# Altium footprint library Footprints_SOC.PcbLib: 182 footprints (part 10 of 12)
Each footprint in its own frame and in the unit in brackets; x right, y up, seen from the top. Pads: shape width x height; smd on the part's side, far side on the other; paste and mask are expansions set on the pad; w line width, h text height; cw(c..) or ccw(c..) is an arc to the next point about the centre after c.
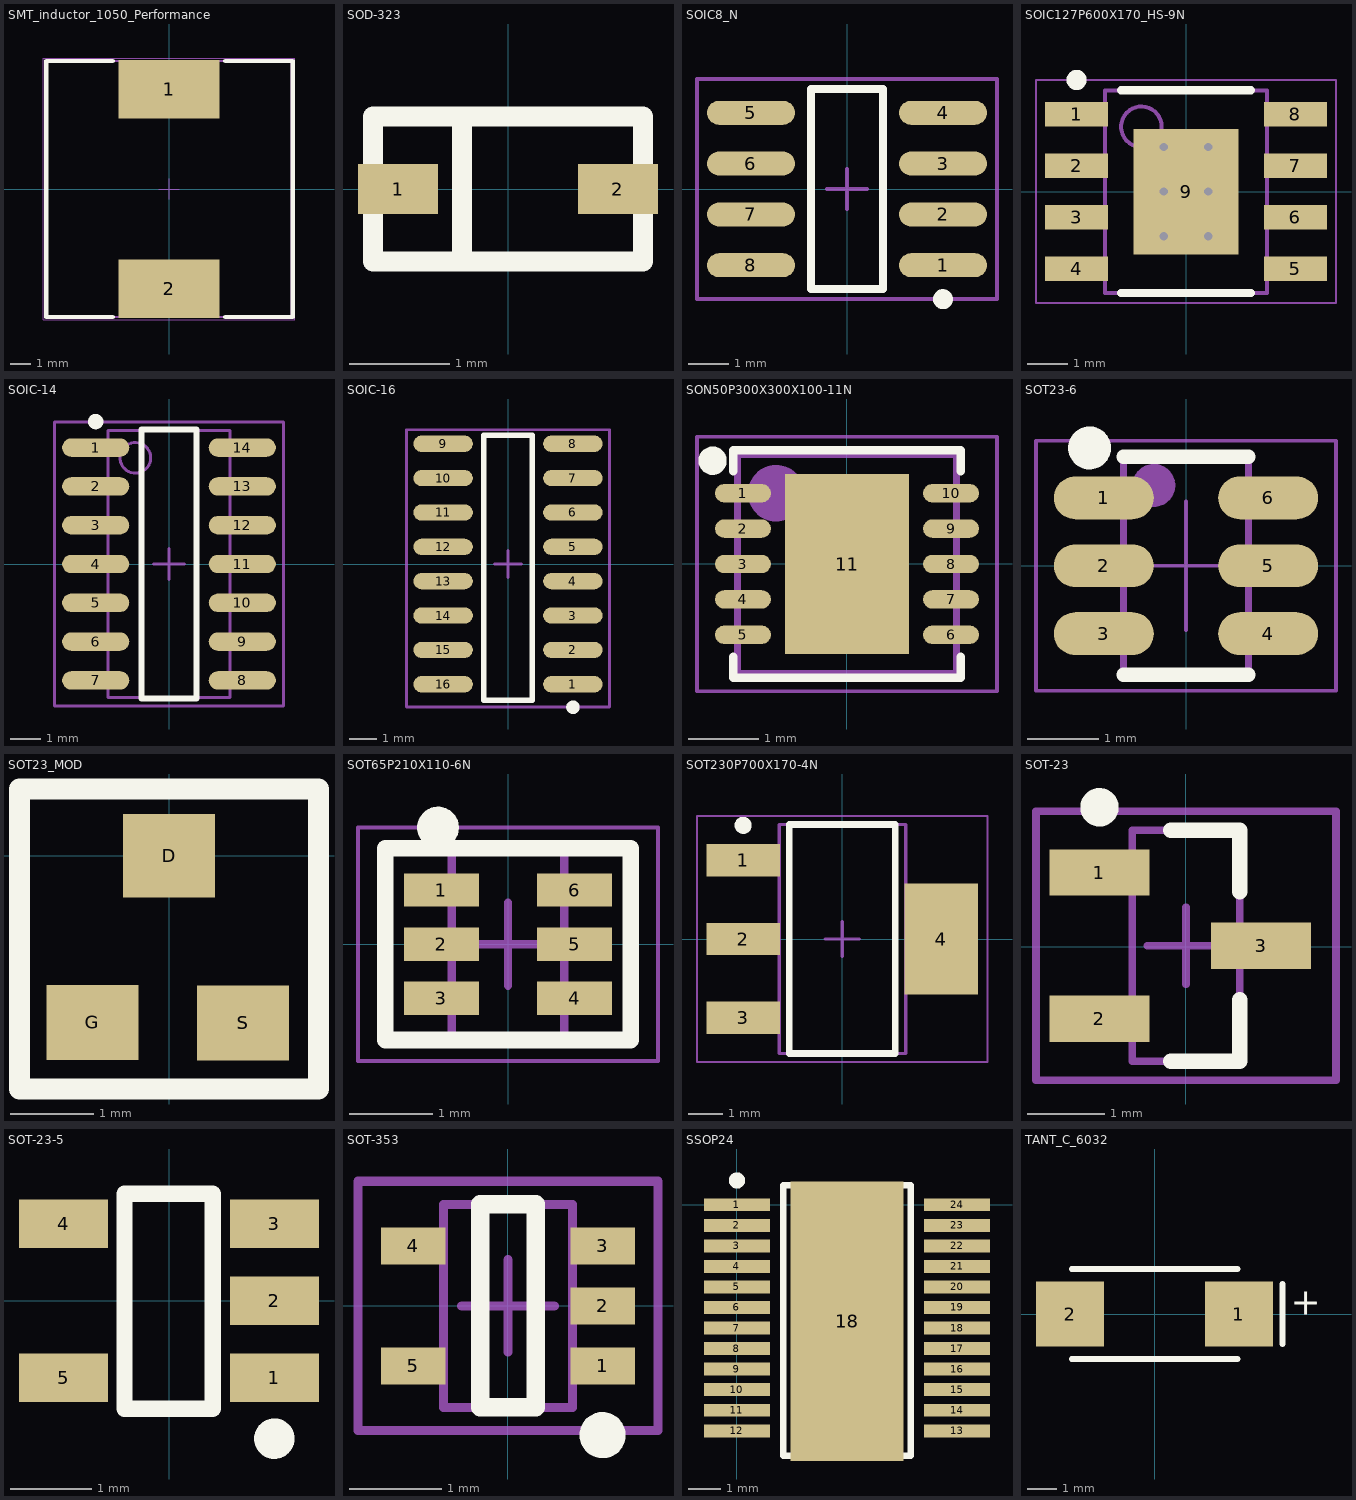
[diagram p9: the footprints below, top view; thin cyan lines are the x and y axes]

## SMT_inductor_1050_Performance [mm] "SMD Shielded Power Inductor, 2-leads, body 10.3x10.5mm"
height 5
pads (2):
  rect 5x2.9 smd: 1(0,4.95) 2(0,-4.95)
Top Overlay:
  lines w0.2: -2.794,-6.35 -6.096,-6.35 -6.096,6.35 -2.794,6.35 ; 2.794,-6.35 6.147,-6.35 6.147,6.35 2.794,6.35
Mechanical 5:
  lines w0.1: -6.096,-6.35 6.096,-6.35 6.096,6.35 -6.096,6.35 -6.096,-6.35
  text ".Designator" at 0,0 h1.02
Mechanical 15:
  lines w0.05: -0.5,0 0.5,0 ; 0,-0.5 0,0.5 ; -6.25,-6.5 6.25,-6.5 6.25,6.5 -6.25,6.5 -6.25,-6.5
3D body "Coilcraft-MSS1210.STEP": height 10.16, standoff -0.04, extent -6.15,-6.15 6.15,6.15

## SOD-323 [mm]
pads (2):
  rect 0.8x0.5 smd: 1(-1.1,0) 2(1.1,0)
Top Overlay:
  lines w0.2: -0.46,-0.725 -0.46,0.725 ; -1.35,-0.725 -1.35,0.725 1.35,0.725 1.35,-0.725 -1.35,-0.725
3D body "SC-76.stp": height 1.1, standoff 0, extent -1.35,-0.725 1.35,0.725

## SOIC8_N [mm] "SOIC, 8-Leads, Body 4.9x3.9mm, Pitch 1.27mm, IPC Medium Density"
height 1.75
pads (8):
  oval 2.2x0.6 smd: 1(2.4,-1.905) 2(2.4,-0.635) 3(2.4,0.635) 4(2.4,1.905) 5(-2.4,1.905) 6(-2.4,0.635) 7(-2.4,-0.635) 8(-2.4,-1.905)
Top Overlay:
  circle w0.25: c2.4,-2.755 r0.125
  lines w0.2: -0.9,-2.5 0.9,-2.5 0.9,2.5 -0.9,2.5 -0.9,-2.5
Mechanical 15:
  lines w0.1: -0.5,0 0.5,0 ; 0,-0.5 0,0.5 ; -3.75,-2.75 3.75,-2.75 3.75,2.75 -3.75,2.75 -3.75,-2.75
3D body "D8-M.step": height 1.76, standoff 0, extent -3.099,-2.502 3.099,2.502

## SOIC127P600X170_HS-9N [mm] "SOIC, 8-Leads, Body 4,90x3,90mm, Pitch 1,27mm, Thermal Pad 3,10x2,60mm, IPC Medium Density"
height 1.7
pads (9):
  rect 1.55x0.6 smd: 1(-2.7,1.905) 2(-2.7,0.635) 3(-2.7,-0.635) 4(-2.7,-1.905) 5(2.7,-1.905) 6(2.7,-0.635) 7(2.7,0.635) 8(2.7,1.905)
  rect 2.6x3.1 smd: 9(0,0)
via 0.55,-1.1 diameter 0.5 hole 0.2
via -0.55,-1.1 diameter 0.5 hole 0.2
via 0.55,0 diameter 0.5 hole 0.2
via -0.55,0 diameter 0.5 hole 0.2
via 0.55,1.1 diameter 0.5 hole 0.2
via -0.55,1.1 diameter 0.5 hole 0.2
Top Overlay:
  circle w0.25: c-2.7,2.755 r0.125
  lines w0.2: -1.6,-2.5 1.6,-2.5 ; -1.6,2.5 1.6,2.5
Mechanical 13:
  circle w0.1: c-1.1,1.6 r0.5
  lines w0.1: -2,-2.5 2,-2.5 2,2.5 -2,2.5 -2,-2.5
Mechanical 15:
  lines w0.05: -3.7,-2.75 3.7,-2.75 3.7,2.75 -3.7,2.75 -3.7,-2.75
  lines w0.1: -0.5,0 0.5,0 ; 0,-0.5 0,0.5
3D body: height 1.7, standoff 0.1, extent -2,-2.5 2,2.5

## SOIC-14 [mm] "SOIC, 14-Leads, Body 8.7x3.9mm, Pitch 1.27mm, IPC Medium Density"
height 1.75
pads (14):
  oval 2.2x0.6 smd: 1(-2.4,3.81) 2(-2.4,2.54) 3(-2.4,1.27) 4(-2.4,0) 5(-2.4,-1.27) 6(-2.4,-2.54) 7(-2.4,-3.81) 8(2.4,-3.81) 9(2.4,-2.54) 10(2.4,-1.27) 11(2.4,0) 12(2.4,1.27) 13(2.4,2.54) 14(2.4,3.81)
Top Overlay:
  circle w0.25: c-2.4,4.66 r0.125
  lines w0.2: -0.9,-4.4 0.9,-4.4 0.9,4.4 -0.9,4.4 -0.9,-4.4
Mechanical 13:
  circle w0.1: c-1.1,3.475 r0.5
  lines w0.1: -2,-4.375 2,-4.375 2,4.375 -2,4.375 -2,-4.375
Mechanical 15:
  lines w0.1: -0.5,0 0.5,0 ; 0,-0.5 0,0.5 ; -3.75,-4.65 3.75,-4.65 3.75,4.65 -3.75,4.65 -3.75,-4.65
3D body "Package, SOIC-14, 3.9mm.STEP": height 1.5, standoff 0, extent -3,-4.475 3,4.475

## SOIC-16 [mm]
height 1.75
pads (16):
  oval 2.2x0.6 smd: 1(2.4,-4.445) 2(2.4,-3.175) 3(2.4,-1.905) 4(2.4,-0.635) 5(2.4,0.635) 6(2.4,1.905) 7(2.4,3.175) 8(2.4,4.445) 9(-2.4,4.445) 10(-2.4,3.175) 11(-2.4,1.905) 12(-2.4,0.635) 13(-2.4,-0.635) 14(-2.4,-1.905) 15(-2.4,-3.175) 16(-2.4,-4.445)
Top Overlay:
  circle w0.25: c2.4,-5.295 r0.125
  lines w0.2: -0.9,-5.04 0.9,-5.04 0.9,4.765 -0.9,4.765 -0.9,-5.04
Mechanical 15:
  lines w0.1: -0.5,0 0.5,0 ; 0,-0.5 0,0.5 ; -3.75,-5.29 3.75,-5.29 3.75,4.965 -3.75,4.965 -3.75,-5.29
3D body "D16-M.step": height 1.76, standoff 0, extent -3.099,-5.004 3.099,5.004

## SON50P300X300X100-11N [mm]
height 1
pads (11):
  oval 0.79x0.26 smd: 1(-1.47,1) 2(-1.47,0.5) 3(-1.47,0) 4(-1.47,-0.5) 5(-1.47,-1) 6(1.47,-1) 7(1.47,-0.5) 8(1.47,0) 9(1.47,0.5) 10(1.47,1)
  rect 1.75x2.55 smd: 11(0,0)
Top Overlay:
  circle w0.2: c-1.9,1.46 r0.1
  lines w0.12: -1.61,-1.31 -1.61,-1.61 1.61,-1.61 1.61,-1.31 ; -1.61,1.31 -1.61,1.61 1.61,1.61 1.61,1.31
Mechanical 13:
  circle w0.4: c-1,1 r0.2
  lines w0.1: -1.55,-1.55 1.55,-1.55 1.55,1.55 -1.55,1.55 -1.55,-1.55
  text ".Designator" at 0.825,-0.86 h1
Mechanical 15:
  lines w0.05: -0.5,0 0.5,0 ; 0,-0.5 0,0.5 ; -2.12,-1.8 -2.12,1.8 2.12,1.8 2.12,-1.8 -2.12,-1.8
3D body: height 5.22, standoff 0, extent -1.674,0.475 -0.476,1.67
3D body: height 1, standoff 0, extent -1.55,-1.55 1.55,1.55

## SOT23-6 [mm]
height 1.45
pads (6):
  oval 1.4x0.6 smd: 1(-1.15,0.95) 2(-1.15,0) 3(-1.15,-0.95) 4(1.15,-0.95) 5(1.15,0) 6(1.15,0.95)
Top Overlay:
  circle w0.3: c-1.35,1.65 r0.15
  lines w0.2: -0.875,-1.525 0.874,-1.525 ; -0.874,1.525 0.875,1.525
Mechanical 13:
  circle w0.3: c-0.45,1.125 r0.15
  lines w0.1: -0.875,-1.525 -0.875,1.525 0.875,1.525 0.875,-1.525 -0.875,-1.525
  text ".Designator" at 0.575,0.35 h0.7
Mechanical 15:
  lines w0.05: -0.9,0 0,0 ; 0,-0.9 0,0 ; 0,0.9 0,0 ; 0.9,0 0,0 ; -2.1,-1.75 -2.1,1.75 2.1,1.75 2.1,-1.75 -2.1,-1.75
3D body "SOT95P270X145-6L50.STEP": height 1.45, standoff 0, extent -1.35,-1.45 1.35,1.45

## SOT23_MOD [mm]
pads (3):
  rect 1.1x1 smd: D(0,0)
  rect 1.1x0.9 smd: G(-0.918,-2) S(0.889,-2.007)
Top Overlay:
  lines w0.254: -1.792,-2.8 -1.792,0.8 1.792,0.8 1.792,-2.8 -1.792,-2.8
3D body "SOT-23.stp": height 1, standoff 0, extent -1.537,-2.3 1.462,0.25

## SOT65P210X110-6N [mm] "SOT23, 6-Leads, Body 2,03x2,10mm, Pitch 0,65mm, IPC Medium Density"
height 1.1
pads (6):
  rect 0.9x0.4 smd: 1(-0.8,0.65) 2(-0.8,0) 3(-0.8,-0.65) 4(0.8,-0.65) 5(0.8,0) 6(0.8,0.65)
Top Overlay:
  circle w0.25: c-0.839,1.4 r0.125
  lines w0.2: -1.473,-1.15 -1.473,1.15 1.473,1.15 1.473,-1.15 -1.473,-1.15
Mechanical 13:
  lines w0.1: -0.675,-1.125 0.675,-1.125 0.675,1.125 -0.675,1.125 -0.675,-1.125
Mechanical 15:
  lines w0.05: -1.8,-1.4 1.8,-1.4 1.8,1.4 -1.8,1.4 -1.8,-1.4
  lines w0.1: -0.5,0 0.5,0 ; 0,-0.5 0,0.5
3D body: height 1.1, standoff 0.05, extent -0.675,-1.125 0.675,1.125

## SOT230P700X170-4N [mm] "SOT223, 4-Leads, Body 6,50x7,00mm (avg), Pitch 2,30mm, IPC Medium Density"
height 1.7
pads (4):
  rect 2.15x0.95 smd: 1(-2.9,2.3) 2(-2.9,0) 3(-2.9,-2.3)
  rect 2.15x3.25 smd: 4(2.9,0)
Top Overlay:
  circle w0.25: c-2.9,3.325 r0.125
  lines w0.2: -1.55,-3.35 -1.55,3.35 1.55,3.35 1.55,-3.35 -1.55,-3.35
Mechanical 13:
  lines w0.1: -1.85,-3.35 -1.85,3.35 1.85,3.35 1.85,-3.35 -1.85,-3.35
Mechanical 15:
  lines w0.05: -4.25,-3.6 -4.25,3.6 4.25,3.6 4.25,-3.6 -4.25,-3.6
  lines w0.1: -0.5,0 0.5,0 ; 0,-0.5 0,0.5
3D body: height 1.7, standoff 0.02, extent -1.85,-3.35 1.85,3.35

## SOT-23 [mm] "SOT23, 3-Leads, Body 2.9x1.3mm, Pitch 0.95mm, Lead Span 2.5mm, IPC Medium Density"
height 1.1
pads (3):
  rect 1.3x0.6 smd: 1(-1.12,0.96) 2(-1.12,-0.94) 3(0.98,0.01)
Top Overlay:
  circle w0.25: c-1.12,1.81 r0.125
  lines w0.2: -0.195,-1.49 0.705,-1.49 0.705,-0.69 ; -0.195,1.51 0.705,1.51 0.705,0.71
Mechanical 13:
  lines w0.1: -0.695,-1.49 -0.695,1.51 0.705,1.51 0.705,-1.49 -0.695,-1.49
Mechanical 15:
  lines w0.1: -0.495,0.01 0.505,0.01 ; 0.005,-0.49 0.005,0.51 ; -1.945,-1.74 -1.945,1.76 1.955,1.76 1.955,-1.74 -1.945,-1.74
3D body "SOT23-3.stp": height 1.2, standoff 0.02, extent -1.418,-1.5 1.418,1.5

## SOT-23-5 [mm] "SOT353, 5-Leads, Body 2x1.3mm, Pitch 0.65mm, Lead Span 2.1mm, IPC Medium Density"
height 1.1
pads (5):
  rect 1.1x0.6 smd: 1(1.3,-0.95) 2(1.3,0) 3(1.3,0.95) 4(-1.3,0.95) 5(-1.3,-0.95)
Top Overlay:
  circle w0.25: c1.3,-1.7 r0.125
  lines w0.2: -0.55,-1.33 -0.55,1.32 0.54,1.32 0.54,-1.33 -0.55,-1.33
3D body "SOT23-5.stp": height 1.2, standoff 0.02, extent -1.418,-1.5 1.418,1.5

## SOT-353 [mm] "SOT353, 5-Leads, Body 2x1.3mm, Pitch 0.65mm, Lead Span 2.1mm, IPC Medium Density"
height 1.1
pads (5):
  rect 0.7x0.4 smd: 1(1.025,-0.65) 2(1.025,0) 3(1.025,0.65) 4(-1.025,0.65) 5(-1.025,-0.65)
Top Overlay:
  circle w0.25: c1.025,-1.4 r0.125
  lines w0.2: -0.3,-1.1 -0.3,1.1 0.3,1.1 0.3,-1.1 -0.3,-1.1
Mechanical 13:
  lines w0.1: -0.7,-1.1 0.7,-1.1 0.7,1.1 -0.7,1.1 -0.7,-1.1
Mechanical 15:
  lines w0.1: -0.5,0 0.5,0 ; 0,-0.5 0,0.5 ; -1.625,-1.35 1.625,-1.35 1.625,1.35 -1.625,1.35 -1.625,-1.35
3D body: height 1.1, standoff 0, extent -0.7,-1.1 0.7,1.1

## SSOP24 [mm] "SSOP; 24 Leads; Body Width 5.3 mm; Pitch 0.65 mm"
height 1.99
pads (25):
  rect 2.05x0.4 smd: 1(0,0) 2(0,-0.635) 3(0,-1.27) 4(0,-1.905) 5(0,-2.54) 6(0,-3.175) 7(0,-3.81) 8(0,-4.445) 9(0,-5.08) 10(0,-5.715) 11(0,-6.35) 12(0,-6.985) 13(6.8,-6.985) 14(6.8,-6.35) 15(6.8,-5.715) 16(6.8,-5.08) 17(6.8,-4.445) 18(6.8,-3.81) 19(6.8,-3.175) 20(6.8,-2.54) 21(6.8,-1.905) 22(6.8,-1.27) 23(6.8,-0.635) 24(6.8,0)
  rect 3.5x8.65 smd: 18(3.4,-3.6)
Top Overlay:
  circle w0.25: c0,0.75 r0.125
  lines w0.2: 1.425,-7.75 5.375,-7.75 5.375,0.6 4.058,0.6 cw(c3.4,0.6) 2.742,0.6 1.425,0.6 1.425,-7.75
3D body "NA__NA__MAXIM INTEGRATED__NA__21-0055H_24--3DModel-Eagle-2522 (1).STEP": height 1.76, standoff 0, extent 0.202,-7.888 6.4,0.85

## TANT_C_6032 [mm]
pads (2):
  rect 2.3x2.2 smd: 1(2.85,0) 2(-2.85,0)
Top Overlay:
  lines w0.2: -2.794,-1.524 2.794,-1.524 ; -2.794,1.524 2.794,1.524 ; 4.318,-1.016 4.318,1.016
  text "+" at 4.6,-0.33 h1.52
3D body "TR3 C-CASE.stp": height 2.56, standoff 0.02, extent -3.099,-1.69 3.099,1.663